# Altium footprint library PBL - THD Packages.PcbLib: 174 footprints (part 3 of 11)
Each footprint in its own frame and in the unit in brackets; x right, y up, seen from the top. Pads: shape width x height; smd on the part's side, far side on the other; paste and mask are expansions set on the pad; w line width, h text height; cw(c..) or ccw(c..) is an arc to the next point about the centre after c.
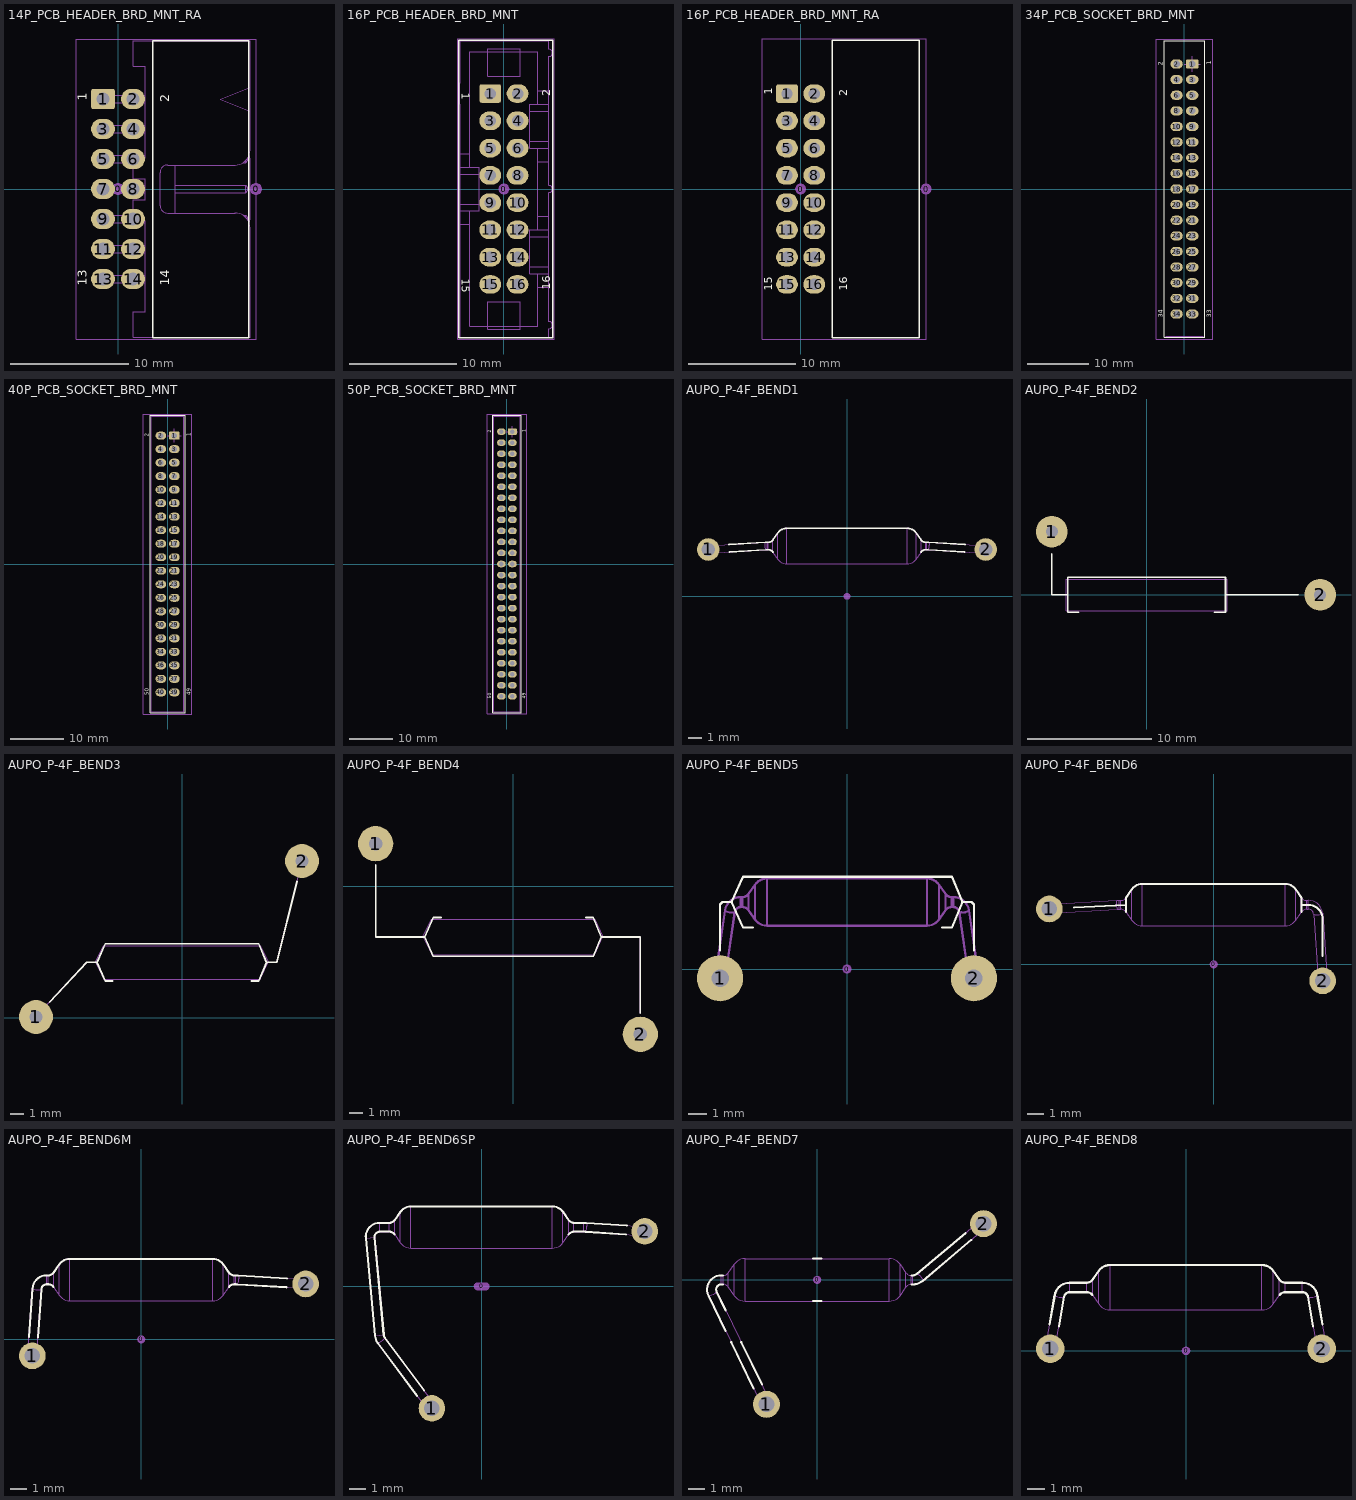
[diagram p2: the footprints below, top view; thin cyan lines are the x and y axes]

## 14P_PCB_HEADER_BRD_MNT_RA [mil] "HEADER BRD MNT R/A 14POS 2.54MM"
height 338
pads (16):
  round 40 on Mech15: 0(0,0) 0(460,0)
  rrect25% 80x68 hole 42: 1(-50,300)
  oval 80x68 hole 42: 2(50,300) 3(-50,200) 4(50,200) 5(-50,100) 6(50,100) 7(-50,0) 8(50,0) 9(-50,-100) 10(50,-100) 11(-50,-200) 12(50,-200) 13(-50,-300) 14(50,-300)
Top Overlay:
  lines w5: 115,-495 435,-495 435,495 115,495 115,-495
  text "13" at -105,-323 h30
  text "14" at 170,-323 h30
  text "1" at -105,295 h30
  text "2" at 170,290 h30
13 - 3D Top Side:
  lines w1.97: -17.5,-312.25 -17.5,-287.75 ; -17.5,-212.25 -17.5,-187.75 ; -17.5,-112.25 -17.5,-87.75 ; -17.5,-12.25 -17.5,12.25 ; -17.5,87.75 -17.5,112.25 ; -17.5,187.75 -17.5,212.25 ; -17.5,287.75 -17.5,312.25 ; 50,-87.75 -62.5,-87.75 -62.5,-112.25 90,-112.25 ; 50,87.75 -62.5,87.75 -62.5,112.25 90,112.25 ; 90,-312.25 -62.5,-312.25 -62.5,-287.75 90,-287.75 ; 90,-212.25 -62.5,-212.25 -62.5,-187.75 90,-187.75 ; 90,-12.25 -62.5,-12.25 -62.5,12.25 90,12.25 ; 90,187.75 -62.5,187.75 -62.5,212.25 90,212.25 ; 90,287.75 -62.5,287.75 -62.5,312.25 90,312.25 ; 190,-80 190,80 ; 190,-12.25 425,-12.25 ; 190,12.25 425,12.25 ; 416.74,-87.75 425,-87.75 ; 416.74,87.75 425,87.75 ; 425,-94.29 425,-87.75 ; 425,94.29 425,87.75 ; 433,-104.25 433,-95.75 425,-87.75 ; 433,104.25 433,95.75 425,87.75 ; 437.7,-115 ccw(c390,-100) 440,-100 440,100 ccw(c390,100) 437.7,115 ; 440,260 340,300 440,340 ; 425,-12.25 433,-4.25 433,4.25 425,12.25 ; 425,-12.25 425,12.25 ; 50,-494 50,-409 90,-409 90,-105 50,-105 50,-35 90,-35 90,35 50,35 50,105 90,105 90,409 50,409 50,494 440,494 440,130 cw(c390,130) 390,80 165,80 ccw(c165,55) 140,55 140,-55 ccw(c165,-55) 165,-80 390,-80 cw(c390,-130) 440,-130 440,-494 50,-494
15 - Top Courtyards:
  lines w3: -140,-500 460,-500 460,500 -140,500 -140,-500
3D body: height 340, standoff -112, extent -62.49,-493.99 440.01,494.01

## 16P_PCB_HEADER_BRD_MNT [mil] "HEADER BRD MNT 16POS 2.54MM"
height 390
pads (17):
  round 40 on Mech15: 0(0,0)
  rrect25% 80x68 hole 42: 1(-50,350)
  oval 80x68 hole 42: 2(50,350) 3(-50,250) 4(50,250) 5(-50,150) 6(50,150) 7(-50,50) 8(50,50) 9(-50,-50) 10(50,-50) 11(-50,-150) 12(50,-150) 13(-50,-250) 14(50,-250) 15(-50,-350) 16(50,-350)
Top Overlay:
  lines w5: -165,-545 180,-545 180,545 -165,545 -165,-545
  text "15" at -155,-329 h30
  text "16" at 170,-370.28 h30
  text "1" at -155,353.57 h30
  text "2" at 170,340 h30
13 - 3D Top Side:
  drawing of 242 lines, arcs and shapes, not listed
15 - Top Courtyards:
  lines w3: -170,-550 185,-550 185,550 -170,550 -170,-550
3D body: height 390, standoff -120, extent -161.99,-543.99 178.01,544.01

## 16P_PCB_HEADER_BRD_MNT_RA [mil] "HEADER BRD MNT R/A 16POS 2.54MM"
height 338
pads (18):
  round 40 on Mech15: 0(0,0) 0(460,0)
  rrect25% 80x68 hole 42: 1(-50,350)
  oval 80x68 hole 42: 2(50,350) 3(-50,250) 4(50,250) 5(-50,150) 6(50,150) 7(-50,50) 8(50,50) 9(-50,-50) 10(50,-50) 11(-50,-150) 12(50,-150) 13(-50,-250) 14(50,-250) 15(-50,-350) 16(50,-350)
Top Overlay:
  lines w5: 115,-545 115,545 435,545 435,-545 115,-545
  text "2" at 170,340 h30
  text "1" at -105,345 h30
  text "16" at 170,-373 h30
  text "15" at -105,-373 h30
15 - Top Courtyards:
  lines w3: -140,-550 -140,550 460,550 460,-550 -140,-550
3D body: height 340, standoff -112, extent -62.24,-543.99 440.01,544.01

## 34P_PCB_SOCKET_BRD_MNT [mm] "SOCKET BRD MNT 34POS 2.54MM"
height 10.8
pads (34):
  rrect25% 2x1.5 hole 1.067: 1(1.27,20.32)
  oval 2x1.5 hole 1.067: 2(-1.27,20.32) 3(1.27,17.78) 4(-1.27,17.78) 5(1.27,15.24) 6(-1.27,15.24) 7(1.27,12.7) 8(-1.27,12.7) 9(1.27,10.16) 10(-1.27,10.16) 11(1.27,7.62) 12(-1.27,7.62) 13(1.27,5.08) 14(-1.27,5.08) 15(1.27,2.54) 16(-1.27,2.54) 17(1.27,0) 18(-1.27,0) 19(1.27,-2.54) 20(-1.27,-2.54) 21(1.27,-5.08) 22(-1.27,-5.08) 23(1.27,-7.62) 24(-1.27,-7.62) 25(1.27,-10.16) 26(-1.27,-10.16) 27(1.27,-12.7) 28(-1.27,-12.7) 29(1.27,-15.24) 30(-1.27,-15.24) 31(1.27,-17.78) 32(-1.27,-17.78) 33(1.27,-20.32) 34(-1.27,-20.32)
Top Overlay:
  lines w0.127: -3.302,-24.13 3.302,-24.13 3.302,24.13 -3.302,24.13 -3.302,-24.13
  text "34" at -3.556,-20.904 h0.76
  text "33" at 4.318,-20.904 h0.76
  text "2" at -3.556,20.066 h0.76
  text "1" at 4.318,20.193 h0.76
13 - 3D Top Side:
  lines w0.076: -3.05,-23.92 3.05,-23.92
15 - Top Courtyards:
  lines w0.076: 0,20.32 2.54,20.32 ; 1.27,19.05 1.27,21.59 ; -4.572,-24.384 4.572,-24.384 4.572,24.384 -4.572,24.384 -4.572,-24.384
3D body: height 10.8, standoff -2.8, extent -3.05,-23.925 4.05,23.915

## 40P_PCB_SOCKET_BRD_MNT [mm] "SOCKET BRD MNT 40POS 2.54MM"
height 10.8
pads (40):
  rrect25% 2x1.5 hole 1.067: 1(1.27,24.13)
  oval 2x1.5 hole 1.067: 2(-1.27,24.13) 3(1.27,21.59) 4(-1.27,21.59) 5(1.27,19.05) 6(-1.27,19.05) 7(1.27,16.51) 8(-1.27,16.51) 9(1.27,13.97) 10(-1.27,13.97) 11(1.27,11.43) 12(-1.27,11.43) 13(1.27,8.89) 14(-1.27,8.89) 15(1.27,6.35) 16(-1.27,6.35) 17(1.27,3.81) 18(-1.27,3.81) 19(1.27,1.27) 20(-1.27,1.27) 21(1.27,-1.27) 22(-1.27,-1.27) 23(1.27,-3.81) 24(-1.27,-3.81) 25(1.27,-6.35) 26(-1.27,-6.35) 27(1.27,-8.89) 28(-1.27,-8.89) 29(1.27,-11.43) 30(-1.27,-11.43) 31(1.27,-13.97) 32(-1.27,-13.97) 33(1.27,-16.51) 34(-1.27,-16.51) 35(1.27,-19.05) 36(-1.27,-19.05) 37(1.27,-21.59) 38(-1.27,-21.59) 39(1.27,-24.13) 40(-1.27,-24.13)
Top Overlay:
  lines w0.127: -3.302,-27.94 3.302,-27.94 3.302,27.94 -3.302,27.94 -3.302,-27.94
  text "1" at 4.318,24.003 h0.76
  text "2" at -3.556,23.876 h0.76
  text "49" at 4.318,-24.714 h0.76
  text "50" at -3.556,-24.714 h0.76
13 - 3D Top Side:
  lines w0.076: -3.05,-27.73 -3.05,27.73 3.05,27.73 3.05,-27.73 -3.05,-27.73
15 - Top Courtyards:
  lines w0.076: 0,24.13 2.54,24.13 ; 1.27,22.86 1.27,25.4 ; -4.572,-28.194 4.572,-28.194 4.572,28.194 -4.572,28.194 -4.572,-28.194
3D body: height 10.8, standoff -2.54, extent -3.05,-27.73 4.05,27.73

## 50P_PCB_SOCKET_BRD_MNT [mm] "SOCKET BRD MNT 50POS 2.54MM"
height 10.8
pads (50):
  rrect25% 2x1.5 hole 1.067: 1(1.27,30.48)
  oval 2x1.5 hole 1.067: 2(-1.27,30.48) 3(1.27,27.94) 4(-1.27,27.94) 5(1.27,25.4) 6(-1.27,25.4) 7(1.27,22.86) 8(-1.27,22.86) 9(1.27,20.32) 10(-1.27,20.32) 11(1.27,17.78) 12(-1.27,17.78) 13(1.27,15.24) 14(-1.27,15.24) 15(1.27,12.7) 16(-1.27,12.7) 17(1.27,10.16) 18(-1.27,10.16) 19(1.27,7.62) 20(-1.27,7.62) 21(1.27,5.08) 22(-1.27,5.08) 23(1.27,2.54) 24(-1.27,2.54) 25(1.27,0) 26(-1.27,0) 27(1.27,-2.54) 28(-1.27,-2.54) 29(1.27,-5.08) 30(-1.27,-5.08) 31(1.27,-7.62) 32(-1.27,-7.62) 33(1.27,-10.16) 34(-1.27,-10.16) 35(1.27,-12.7) 36(-1.27,-12.7) 37(1.27,-15.24) 38(-1.27,-15.24) 39(1.27,-17.78) 40(-1.27,-17.78) 41(1.27,-20.32) 42(-1.27,-20.32) 43(1.27,-22.86) 44(-1.27,-22.86) 45(1.27,-25.4) 46(-1.27,-25.4) 47(1.27,-27.94) 48(-1.27,-27.94) 49(1.27,-30.48) 50(-1.27,-30.48)
Top Overlay:
  lines w0.127: -3.302,-34.29 3.302,-34.29 3.302,34.29 -3.302,34.29 -3.302,-34.29
  text "1" at 4.318,30.353 h0.76
  text "2" at -3.556,30.226 h0.76
  text "49" at 4.318,-31.064 h0.76
  text "50" at -3.556,-31.064 h0.76
13 - 3D Top Side:
  lines w0.076: -3.05,-34.08 -3.05,34.08 3.05,34.08 3.05,-34.08 -3.05,-34.08
15 - Top Courtyards:
  lines w0.076: 0,30.48 2.54,30.48 ; 1.27,29.21 1.27,31.75 ; -4.572,-34.544 4.572,-34.544 4.572,34.544 -4.572,34.544 -4.572,-34.544
3D body: height 10.8, standoff -2.8, extent -3.05,-34.085 4.05,34.075

## AUPO_P-4F_BEND1 [mil] "Aupo P-4F TCO for positioning on IC legs"
height 100
pads (3):
  round 19.68 on Mech15: 0(0,0)
  round 65 / inner round 65 / far side round 90 hole 38: 1(-400,135) 2(400,135)
Top Overlay:
  lines w5: -339.97,149.43 -235.55,155.67 -232.42,155.8 -230.32,155.83 -226.38,155.83 ccw(c-226.38,171.57) -213.48,162.54 -199.33,182.75 cw(c-173.53,164.69) -173.53,196.18 173.53,196.18 cw(c173.53,164.69) 199.33,182.75 213.48,162.54 ccw(c226.38,171.57) 226.38,155.83 230.32,155.83 233.46,155.77 235.55,155.67 340.26,149.42 ; -338.67,127.82 -234.26,134.06 -232.69,134.13 -230.32,134.17 -226.38,134.17 cw(c-226.38,118.43) -213.48,127.46 ; 213.48,127.46 cw(c226.38,118.43) 226.38,134.17 230.32,134.17 231.91,134.15 234.26,134.06 338.97,127.8
13 - 3D Top Side:
  lines w1.97: -381.43,146.96 ccw(c-360.21,137.38) -380.14,125.34 ; 380.14,125.34 ccw(c367.63,134.29) 382.82,136.67 382.89,139.15 382.84,141.46 382.68,143.49 382.42,145.12 382.08,146.27 381.66,146.87 381.43,146.96 ; -235.55,155.67 ccw(c-214.34,146.09) -234.26,134.06 ; -235.55,155.67 -400.65,145.81 ccw(c-400,135) -399.35,124.19 -234.26,134.06 ; -235.55,155.67 -232.42,155.8 -230.32,155.83 ; -234.26,134.06 -232.69,134.13 -230.32,134.17 ; -230.32,134.17 -230.32,155.83 ; -230.32,134.17 -226.38,134.17 ; -230.32,155.83 -226.38,155.83 ; -226.38,134.17 cw(c-226.38,118.43) -213.48,127.46 ; -226.38,134.17 -226.38,155.83 ; -226.38,155.83 ccw(c-226.38,171.57) -213.48,162.54 ; -213.48,127.46 -213.48,162.54 ; -213.48,127.46 -199.33,107.25 ; -213.48,162.54 -199.33,182.75 ; -199.33,107.25 ccw(c-173.53,125.31) -173.53,93.82 ; -199.33,107.25 -199.33,182.75 ; -199.33,182.75 cw(c-173.53,164.69) -173.53,196.18 ; -173.53,93.82 -173.53,196.18 ; -173.53,93.82 173.53,93.82 ; -173.53,196.18 173.53,196.18 ; 173.53,93.82 ccw(c173.53,125.31) 199.33,107.25 ; 173.53,93.82 173.53,196.18 ; 173.53,196.18 cw(c173.53,164.69) 199.33,182.75 ; 199.33,107.25 199.33,182.75 ; 199.33,107.25 213.48,127.46 ; 199.33,182.75 213.48,162.54 ; 213.48,127.46 cw(c226.38,118.43) 226.38,134.17 ; 213.48,127.46 213.48,162.54 ; 213.48,162.54 ccw(c226.38,171.57) 226.38,155.83 ; 226.38,134.17 226.38,155.83 ; 226.38,134.17 230.32,134.17 ; 226.38,155.83 230.32,155.83 ; 230.32,134.17 230.32,155.83 ; 230.32,134.17 231.91,134.15 234.26,134.06 ; 230.32,155.83 233.46,155.77 235.55,155.67 ; 234.26,134.06 ccw(c221.76,143) 236.94,145.39 237.01,147.87 236.96,150.18 236.8,152.21 236.54,153.84 236.19,154.98 235.77,155.59 235.55,155.67 ; 234.26,134.06 399.35,124.19 ccw(c400,135) 400.65,145.81 235.55,155.67
3D body: height 40, standoff 0, extent -444.64,90.1 -355,179.92
3D body: height 104.36, standoff -98, extent -410.74,93.93 410.83,196.09
3D body: height 40, standoff 0, extent 355.36,90.1 445,179.92

## AUPO_P-4F_BEND2 [mil] "Aupo P-4F TCO for positioning on IC legs"
height 100
pads (2):
  round 100 hole 38: 1(-300,200) 2(550,0)
Top Overlay:
  lines w5: -300,130 -300,0 -250,0 ; -215,-55 -250,-55 -250,55 250,55 250,-55 215,-55 ; 250,0 480,0
13 - 3D Top Side:
  lines w3: -255,-50 -255,49.8 255,49.8 255,-50 -255,-50
3D body: height 55, standoff -95, extent -310,190.02 -290.08,209.98
3D body: height 65, standoff 45.08, extent -309.98,-0.02 -290.02,199.98
3D body: height 65, standoff 45.08, extent -299.5,-9.96 -254.5,10
3D body: height 65, standoff 45.08, extent 250,-9.96 550,10
3D body: height 104.61, standoff 5, extent -255,-50 255,49.8
3D body: height 55, standoff -95, extent 540,-9.98 559.92,9.99
3D body: height 65, standoff 45, extent 540,-9.98 559.9,9.94
3D body: height 65, standoff 45, extent -310,190.02 -290.1,209.94
3D body: height 65, standoff 45, extent -310,-10 -290.1,9.91

## AUPO_P-4F_BEND3 [mil] "Aupo P-4F TCO for positioning on IC legs"
height 100
pads (2):
  round 100 hole 38: 1(-431,3) 2(354,463)
Top Overlay:
  lines w5: -389.97,47.04 -281,164 -251,164 ; -205,109 -226.33,109 -251,164 ; 205,109 226.41,109 249,164 ; 338.95,403.01 279,164 249,164 ; -251,164 -226.38,219 226.38,219 249,164
13 - 3D Top Side:
  lines w3: -431,3 -280.63,164.37 -256,164.37 -231.3,213.8 231.3,213.8 254,164.37 278.63,164.37 354,463 ; -256,163.9 -231.3,114 231.3,114 254,163.9
3D body: height 105.02, standoff -94.88, extent -440.35,-6.96 364.65,473.01

## AUPO_P-4F_BEND4 [mil] "Aupo P-4F TCO for positioning on IC legs"
height 100
pads (2):
  round 100 hole 38: 1(-390,120) 2(360,-420)
Top Overlay:
  lines w5: -390,60 -390,-144 -251,-144 ; -226.38,-199 226.38,-199 249,-144 ; -226.38,-89 -251,-144 ; -226.33,-199 -251,-144 ; -226.33,-89 -205,-89 ; 205,-89 226.41,-89 249,-144 ; 360,-360 360,-144 249,-144
13 - 3D Top Side:
  lines w3: -390,60 -390,-144 -256,-144 ; -256,-144.1 -231.3,-194 231.3,-194 254,-144.1 ; -256,-143.63 -231.3,-94.2 231.3,-94.2 254,-143.63 ; 254,-144 360,-144 360,-360
3D body: height 105.02, standoff -94.88, extent -399.95,-430.6 369.97,129.36

## AUPO_P-4F_BEND5 [mil] "Aupo P-4F TCO for positioning on IC legs"
height 100
pads (3):
  round 19.68 on Mech15: 0(0,0)
  round 100 hole 38: 1(-275,-20) 2(275,-20)
Top Overlay:
  lines w5: -275,40 -275,140 -270,145 -250,145 ; -204,90 -225.33,90 -250,145 ; 206,90 227.41,90 250,145 ; 275,40 275,140 270,145 250,145 ; -250,145 -225.38,200 227.38,200 250,145
13 - 3D Top Side:
  lines w5: -282.92,0.59 ccw(c-269.19,19.56) -261.5,-2.55 ; 261.5,-2.55 ccw(c268.97,22.97) 282.85,0.28 282.92,0.59 ; -264.41,126.68 ccw(c-250.67,145.69) -242.98,123.53 ; -264.41,126.68 cw(c-230.49,121.52) -230.32,155.83 ; -264.41,126.68 -285.71,-18.43 ccw(c-275,-20) -264.29,-21.57 -242.98,123.54 ; -242.98,123.54 cw(c-230.48,121.51) -230.32,134.17 ; -230.32,134.17 -230.32,155.83 ; -230.32,134.17 -226.38,134.17 ; -230.32,155.83 -226.38,155.83 ; -226.38,134.17 cw(c-226.38,118.43) -213.48,127.46 ; -226.38,134.17 -226.38,155.83 ; -226.38,155.83 ccw(c-226.38,171.57) -213.48,162.54 ; -213.48,127.46 -213.48,162.54 ; -213.48,127.46 -199.33,107.25 ; -213.48,162.54 -199.33,182.75 ; -199.33,107.25 ccw(c-173.53,125.31) -173.53,93.82 ; -199.33,107.25 -199.33,182.75 ; -199.33,182.75 cw(c-173.53,164.69) -173.53,196.18 ; -173.53,93.82 -173.53,196.18 ; -173.53,93.82 173.53,93.82 ; -173.53,196.18 173.53,196.18 ; 173.53,93.82 ccw(c173.53,125.31) 199.33,107.25 ; 173.53,93.82 173.53,196.18 ; 173.53,196.18 cw(c173.53,164.69) 199.33,182.75 ; 199.33,107.25 199.33,182.75 ; 199.33,107.25 213.48,127.46 ; 199.33,182.75 213.48,162.54 ; 213.48,127.46 cw(c226.38,118.43) 226.38,134.17 ; 213.48,127.46 213.48,162.54 ; 213.48,162.54 ccw(c226.38,171.57) 226.38,155.83 ; 226.38,134.17 226.38,155.83 ; 226.38,134.17 230.32,134.17 ; 226.38,155.83 230.32,155.83 ; 230.32,134.17 cw(c230.48,121.51) 242.98,123.54 ; 230.32,134.17 230.32,155.83 ; 230.32,155.83 cw(c230.49,121.51) 264.41,126.68 ; 242.98,123.54 ccw(c250.45,149.1) 264.34,126.38 264.41,126.68 ; 242.98,123.54 264.29,-21.57 ccw(c275,-20) 285.83,-20 285.71,-18.43 264.41,126.68
3D body: height 102.36, standoff -100, extent -285.73,-30.8 285.83,196.09

## AUPO_P-4F_BEND6 [mil] "Aupo P-4F TCO for positioning on IC legs"
height 100
pads (3):
  round 19.68 on Mech15: 0(0,0)
  round 65 / inner round 65 / far side round 90 hole 38: 1(-400,135) 2(265,-40)
Top Overlay:
  lines w5: -340.17,138.21 -213.48,145 ; -213.48,127.46 -213.48,162.54 -199.33,182.75 cw(c-173.53,164.69) -173.53,196.18 173.53,196.18 cw(c173.53,164.69) 199.33,182.75 213.48,162.54 213.48,127.46 ; 213.48,145 230,145 cw(c230,110) 265,110 265,20
13 - 3D Top Side:
  lines w1.97: -381.43,146.96 ccw(c-359.97,137.39) -380.14,125.34 ; 252.86,-21.08 ccw(c262.11,4.31) 274.45,-19.73 274.46,-19.61 ; -235.55,155.67 ccw(c-214.1,146.11) -234.26,134.06 ; -235.55,155.67 -400.65,145.81 ccw(c-400,135) -399.35,124.19 -234.26,134.06 ; -235.55,155.67 -232.3,155.8 -230.32,155.83 ; -234.26,134.06 -232.78,134.13 -230.32,134.17 ; -230.32,134.17 -230.32,155.83 ; -230.32,134.17 -226.38,134.17 ; -230.32,155.83 -226.38,155.83 ; -226.38,134.17 cw(c-226.38,118.43) -213.48,127.46 ; -226.38,134.17 -226.38,155.83 ; -226.38,155.83 ccw(c-226.38,171.57) -213.48,162.54 ; -213.48,127.46 -199.33,107.25 ; -213.48,127.46 -213.48,162.54 ; -213.48,162.54 -199.33,182.75 ; -199.33,107.25 ccw(c-173.53,125.31) -173.53,93.82 ; -199.33,107.25 -199.33,182.75 ; -199.33,182.75 cw(c-173.53,164.69) -173.53,196.18 ; -173.53,93.82 -173.53,196.18 ; -173.53,93.82 173.53,93.82 ; -173.53,196.18 173.53,196.18 ; 173.53,93.82 ccw(c173.53,125.31) 199.33,107.25 ; 173.53,93.82 173.53,196.18 ; 173.53,196.18 cw(c173.53,164.69) 199.33,182.75 ; 199.33,107.25 199.33,182.75 ; 199.33,107.25 213.48,127.46 ; 199.33,182.75 213.48,162.54 ; 213.48,127.46 cw(c226.38,118.43) 226.38,134.17 ; 213.48,127.46 213.48,162.54 ; 213.48,162.54 ccw(c226.38,171.57) 226.38,155.83 ; 226.38,134.17 226.38,155.83 ; 226.38,134.17 230.32,134.17 ; 226.38,155.83 230.32,155.83 ; 230.32,134.17 cw(c230.47,121.52) 243.08,122.53 ; 230.32,134.17 230.32,155.83 ; 230.32,155.83 cw(c230.46,121.51) 264.69,124 ; 243.08,122.53 ccw(c252.33,147.93) 264.67,123.88 264.69,124 ; 243.08,122.53 254.2,-40.74 ccw(c265,-40) 275.83,-40 275.8,-39.26 264.69,124
3D body: height 40, standoff 0, extent -445,90.09 -355.36,179.91
3D body: height 102.87, standoff -99.49, extent -410.74,-50.8 275.83,196.09
3D body: height 40, standoff 0, extent 219.99,-84.91 309.64,4.91

## AUPO_P-4F_BEND6M [mil] "Aupo P-4F TCO for positioning on IC legs"
height 100
pads (3):
  round 19.68 on Mech15: 0(0,0)
  round 65 / inner round 65 / far side round 90 hole 38: 1(-265,-40) 2(400,135)
Top Overlay:
  lines w5: -272.66,6.54 -264.69,124.01 cw(c-230.48,121.53) -230.32,155.83 -226.38,155.83 ccw(c-226.38,171.57) -213.48,162.54 -199.33,182.75 cw(c-173.53,164.69) -173.53,196.18 173.53,196.18 cw(c173.53,164.69) 199.33,182.75 213.48,162.54 ccw(c226.38,171.57) 226.38,155.83 230.32,155.83 233.67,155.76 235.64,155.67 354.91,148.54 ; -251.05,5.07 -243.08,122.54 cw(c-230.46,121.51) -230.32,134.17 -226.38,134.17 cw(c-226.38,118.43) -213.48,127.46 ; 213.48,127.46 cw(c226.38,118.43) 226.38,134.17 230.32,134.17 231.82,134.16 234.34,134.05 353.62,126.93
13 - 3D Top Side:
  lines w1.97: -274.43,-19.69 ccw(c-262.06,2.73) -252.83,-21.16 ; 380.23,125.34 ccw(c367.39,134.41) 382.95,136.67 383.02,139.06 382.98,141.3 382.83,143.28 382.58,144.91 382.25,146.1 381.85,146.78 381.52,146.95 ; -264.69,124.01 ccw(c-252.3,146.47) -243.08,122.54 ; -264.69,124.01 cw(c-230.48,121.53) -230.32,155.83 ; -264.69,124.01 -275.76,-39.27 ccw(c-264.96,-40) -254.16,-40.73 -243.08,122.54 ; -243.08,122.54 cw(c-230.46,121.51) -230.32,134.17 ; -230.32,134.17 -230.32,155.83 ; -230.32,134.17 -226.38,134.17 ; -230.32,155.83 -226.38,155.83 ; -226.38,134.17 cw(c-226.38,118.43) -213.48,127.46 ; -226.38,134.17 -226.38,155.83 ; -226.38,155.83 ccw(c-226.38,171.57) -213.48,162.54 ; -213.48,127.46 -213.48,162.54 ; -213.48,127.46 -199.33,107.25 ; -213.48,162.54 -199.33,182.75 ; -199.33,107.25 ccw(c-173.53,125.31) -173.53,93.82 ; -199.33,107.25 -199.33,182.75 ; -199.33,182.75 cw(c-173.53,164.69) -173.53,196.18 ; -173.53,93.82 -173.53,196.18 ; -173.53,93.82 173.53,93.82 ; -173.53,196.18 173.53,196.18 ; 173.53,93.82 ccw(c173.53,125.31) 199.33,107.25 ; 173.53,93.82 173.53,196.18 ; 173.53,196.18 cw(c173.53,164.69) 199.33,182.75 ; 199.33,107.25 199.33,182.75 ; 199.33,107.25 213.48,127.46 ; 199.33,182.75 213.48,162.54 ; 213.48,127.46 cw(c226.38,118.43) 226.38,134.17 ; 213.48,127.46 213.48,162.54 ; 213.48,162.54 ccw(c226.38,171.57) 226.38,155.83 ; 226.38,134.17 226.38,155.83 ; 226.38,134.17 230.32,134.17 ; 226.38,155.83 230.32,155.83 ; 230.32,134.17 230.32,155.83 ; 230.32,134.17 231.82,134.16 234.34,134.05 ; 230.32,155.83 233.67,155.76 235.64,155.67 ; 234.34,134.05 ccw(c221.51,143.13) 237.07,145.38 237.13,147.77 237.09,150.02 236.94,152 236.69,153.63 236.36,154.82 235.96,155.5 235.64,155.67 ; 234.34,134.05 399.35,124.19 ccw(c400,135) 400.65,145.81 235.64,155.67
3D body: height 40, standoff 0, extent -309.64,-84.91 -220,4.92
3D body: height 102.95, standoff -100, extent -275.7,-50.8 410.83,196.09
3D body: height 40, standoff 0, extent 355.36,90.1 445,179.92

## AUPO_P-4F_BEND6SP [mil] "Aupo P-4F TCO for positioning on IC legs"
height 100
pads (3):
  oval 39.37x19.68 on Mech15: 0(0,0)
  round 65 / inner round 65 / far side round 90 hole 38: 1(-122.05,-299.21) 2(400,135)
Top Overlay:
  lines w5: -213.48,127.46 ccw(c-226.38,118.43) -226.38,134.17 -250,134.17 ccw(c-250,121.38) -262.74,120.18 -240.21,-119.23 ccw(c-226.81,-118) -237.62,-126.01 -141.14,-255.47 ; -158.51,-268.41 -254.99,-138.95 cw(c-226.81,-118) -261.77,-121.26 -284.3,118.15 cw(c-250,121.38) -250,155.83 -226.38,155.83 ccw(c-226.38,171.57) -213.48,162.54 -199.33,182.75 cw(c-173.53,164.69) -173.53,196.18 173.53,196.18 cw(c173.53,164.69) 199.33,182.75 213.48,162.54 ccw(c226.38,171.57) 226.38,155.83 250,155.83 253.99,155.74 256.09,155.62 355.88,148.85 ; 213.48,127.46 cw(c226.38,118.43) 226.38,134.17 250,134.17 251.63,134.15 254.63,134.02 354.42,127.24
13 - 3D Top Side:
  lines w1.97: -142.8,-289.48 ccw(c-154.49,-254.64) -126.6,-278.57 -125.76,-277.53 -125.4,-276.81 -125.44,-276.54 ; 380.81,125.45 ccw(c367.01,135.36) 383.94,136.83 384,139.39 383.93,141.77 383.72,143.84 383.38,145.46 382.93,146.54 382.4,147.03 382.28,147.05 ; -284.3,118.15 cw(c-250,121.38) -250,155.83 ; -284.3,118.15 -261.77,-121.26 ; -284.3,118.15 -262.74,120.18 ; -262.74,120.18 cw(c-250,121.38) -250,134.17 ; -262.74,120.18 -240.21,-119.23 ; -261.77,-121.26 ccw(c-226.81,-118) -254.99,-138.95 ; -261.77,-121.26 -240.21,-119.23 ; -254.99,-138.95 ccw(c-266.66,-104.11) -238.78,-128.04 -237.94,-127 -237.58,-126.28 -237.62,-126.01 ; -254.99,-138.95 -130.73,-305.68 ccw(c-122.05,-299.21) -113.37,-292.74 -237.62,-126.01 ; -250,134.17 -226.38,134.17 ; -250,134.17 -250,155.83 ; -250,155.83 -226.38,155.83 ; -240.21,-119.23 ccw(c-226.81,-118) -237.62,-126.01 ; -226.38,134.17 cw(c-226.38,118.43) -213.48,127.46 ; -226.38,134.17 -226.38,155.83 ; -226.38,155.83 ccw(c-226.38,171.57) -213.48,162.54 ; -213.48,127.46 -199.33,107.25 ; -213.48,127.46 -213.48,162.54 ; -213.48,162.54 -199.33,182.75 ; -199.33,107.25 ccw(c-173.53,125.31) -173.53,93.82 ; -199.33,107.25 -199.33,182.75 ; -199.33,182.75 cw(c-173.53,164.69) -173.53,196.18 ; -173.53,93.82 173.53,93.82 ; -173.53,93.82 -173.53,196.18 ; -173.53,196.18 173.53,196.18 ; 173.53,93.82 ccw(c173.53,125.31) 199.33,107.25 ; 173.53,93.82 173.53,196.18 ; 173.53,196.18 cw(c173.53,164.69) 199.33,182.75 ; 199.33,107.25 213.48,127.46 ; 199.33,107.25 199.33,182.75 ; 199.33,182.75 213.48,162.54 ; 213.48,127.46 cw(c226.38,118.43) 226.38,134.17 ; 213.48,127.46 213.48,162.54 ; 213.48,162.54 ccw(c226.38,171.57) 226.38,155.83 ; 226.38,134.17 250,134.17 ; 226.38,134.17 226.38,155.83 ; 226.38,155.83 250,155.83 ; 250,134.17 251.63,134.15 254.63,134.02 ; 250,134.17 250,155.83 ; 250,155.83 253.99,155.74 256.09,155.62 ; 254.63,134.02 ccw(c240.84,143.92) 257.75,145.39 257.82,147.96 257.74,150.34 257.53,152.4 257.19,154.02 256.74,155.11 256.22,155.6 256.09,155.62 ; 254.63,134.02 399.27,124.2 ccw(c400,135) 400.73,145.8 256.09,155.62
3D body: height 40, standoff 0, extent -166.69,-344.12 -77.04,-254.29
3D body: height 102.95, standoff -100, extent -284.29,-310.01 410.83,196.09
3D body: height 40, standoff 0, extent 355.36,90.1 445,179.92

## AUPO_P-4F_BEND7 [mil] "Aupo P-4F TCO for positioning on IC legs"
height 100
pads (3):
  round 19.68 on Mech15: 0(0,0)
  round 65 / inner round 65 / far side round 90 hole 38: 1(-122.05,-299.21) 2(400,135)
Top Overlay:
  lines w5: -226.38,-10.83 -230.32,-10.83 ccw(c-230.71,-23.12) -241.92,-28.19 -220,-73.23 ; -226.38,10.83 -230.32,10.83 ccw(c-230.77,-23.09) -261.39,-37.67 -220,-122.7 ; -206.71,-150 -152.67,-261.03 ; -182.63,-150 -133.2,-251.56 ; -10,-51.18 10,-51.18 ; -10,51.18 10,51.18 ; 226.38,-10.83 230.32,-10.83 ccw(c230.57,25.09) 253.54,-2.52 370.8,96.25 ; 226.38,10.83 230.32,10.83 ccw(c230.51,25.26) 239.59,14.04 356.85,112.81
13 - 3D Top Side:
  lines w1.97: -140.07,-286.92 ccw(c-140.58,-259.77) -121.17,-278.77 -120.63,-277.98 -120.6,-277.44 ; 380.65,132.86 381.22,133.11 382.26,133.05 383.6,132.53 385.15,131.57 386.84,130.24 388.57,128.61 390.25,126.76 391.78,124.79 393.1,122.81 394.11,120.92 394.78,119.23 395.06,117.83 394.95,116.8 394.6,116.3 ; -261.39,-37.67 ccw(c-261.89,-10.52) -242.49,-29.52 -241.95,-28.73 -241.91,-28.2 ; -261.39,-37.67 cw(c-230.77,-23.09) -230.32,10.83 ; -261.39,-37.67 -131.78,-303.95 ccw(c-122.05,-299.21) -111.22,-299.21 -111.51,-296.72 -112.31,-294.47 -241.92,-28.19 ; -241.92,-28.19 cw(c-230.71,-23.12) -230.32,-10.83 ; -230.32,-10.83 -230.32,10.83 ; -230.32,-10.83 -226.38,-10.83 ; -230.32,10.83 -226.38,10.83 ; -226.38,-10.83 cw(c-226.38,-26.57) -213.48,-17.54 ; -226.38,-10.83 -226.38,10.83 ; -226.38,10.83 ccw(c-226.38,26.57) -213.48,17.54 ; -213.48,-17.54 -213.48,17.54 ; -213.48,-17.54 -199.33,-37.75 ; -213.48,17.54 -199.33,37.75 ; -199.33,-37.75 ccw(c-173.53,-19.69) -173.53,-51.18 ; -199.33,-37.75 -199.33,37.75 ; -199.33,37.75 cw(c-173.53,19.69) -173.53,51.18 ; -173.53,-51.18 -173.53,51.18 ; -173.53,-51.18 173.53,-51.18 ; -173.53,51.18 173.53,51.18 ; 173.53,-51.18 ccw(c173.53,-19.68) 199.33,-37.75 ; 173.53,-51.18 173.53,51.18 ; 173.53,51.18 cw(c173.53,19.69) 199.33,37.75 ; 199.33,-37.75 199.33,37.75 ; 199.33,-37.75 213.48,-17.54 ; 199.33,37.75 213.48,17.54 ; 213.48,-17.54 cw(c226.38,-26.57) 226.38,-10.83 ; 213.48,-17.54 213.48,17.54 ; 213.48,17.54 ccw(c226.38,26.57) 226.38,10.83 ; 226.38,-10.83 226.38,10.83 ; 226.38,-10.83 230.32,-10.83 ; 226.38,10.83 230.32,10.83 ; 230.32,-10.83 ccw(c230.57,25.09) 253.54,-2.52 ; 230.32,-10.83 230.32,10.83 ; 230.32,10.83 ccw(c230.51,25.26) 239.59,14.04 ; 239.59,14.04 393.03,143.28 cw(c400,135) 406.98,126.72 253.54,-2.52 ; 239.59,14.04 240.15,14.29 241.2,14.23 242.54,13.7 244.09,12.75 245.78,11.42 247.51,9.79 249.19,7.94 250.72,5.97 252.03,3.99 253.05,2.1 253.72,0.41 254,-0.99 253.88,-2.02 253.54,-2.52
3D body: height 40, standoff 0, extent 355.36,90.1 445,179.92
3D body: height 137.8, standoff -100, extent -264.69,-310.01 410.83,145.81
3D body: height 40, standoff 0, extent -166.69,-344.12 -77.04,-254.29

## AUPO_P-4F_BEND8 [mil] "Aupo P-4F TCO for positioning on IC legs"
height 100
pads (3):
  round 19.68 on Mech15: 0(0,0)
  round 65 / inner round 65 / far side round 90 hole 38: 1(-310,5) 2(310,5)
Top Overlay:
  lines w5: -311.41,60.24 -299.71,127.69 cw(c-266,121.56) -265.75,155.83 -226.38,155.83 ccw(c-226.38,171.57) -213.48,162.54 -199.33,182.75 cw(c-173.53,164.69) -173.53,196.18 173.53,196.18 cw(c173.53,164.69) 199.33,182.75 213.48,162.54 ccw(c226.38,171.57) 226.38,155.83 265.75,155.83 cw(c265.99,121.56) 299.71,127.69 311.41,60.24 ; -290.07,56.54 -278.37,123.99 cw(c-265.97,121.53) -265.75,134.17 -226.38,134.17 cw(c-226.38,118.43) -213.48,127.46 ; 213.48,127.46 cw(c226.38,118.43) 226.38,134.17 265.75,134.17 cw(c266,121.57) 278.37,123.99 290.07,56.54
13 - 3D Top Side:
  lines w1.97: -317.54,24.86 -317.55,24.7 -317.24,24.12 -316.45,23.48 -315.22,22.83 -313.59,22.18 -311.65,21.57 -309.48,21.03 -307.2,20.58 -304.9,20.24 -302.69,20.03 -300.67,19.97 -298.95,20.04 -297.6,20.25 -296.68,20.6 -296.24,21.05 -296.21,21.16 ; -299.62,127.25 ccw(c-286.09,144.54) -278.37,123.99 ; 296.21,21.16 ccw(c303.94,41.66) 317.46,24.42 317.54,24.86 ; 299.62,127.25 cw(c286.09,144.54) 278.37,123.99 ; -278.37,123.99 cw(c-265.97,121.53) -265.75,134.17 ; -278.37,123.99 -299.33,3.15 cw(c-310,5) -320.67,6.85 -299.71,127.69 cw(c-266,121.56) -265.75,155.83 ; -265.75,134.17 -226.38,134.17 ; -265.75,134.17 -265.75,155.83 ; -265.75,155.83 -226.38,155.83 ; -226.38,134.17 cw(c-226.38,118.43) -213.48,127.46 ; -226.38,134.17 -226.38,155.83 ; -226.38,155.83 ccw(c-226.38,171.57) -213.48,162.54 ; -213.48,127.46 -199.33,107.25 ; -213.48,127.46 -213.48,162.54 ; -213.48,162.54 -199.33,182.75 ; -199.33,107.25 ccw(c-173.53,125.31) -173.53,93.82 ; -199.33,107.25 -199.33,182.75 ; -199.33,182.75 cw(c-173.53,164.69) -173.53,196.18 ; -173.53,93.82 173.53,93.82 ; -173.53,93.82 -173.53,196.18 ; -173.53,196.18 173.53,196.18 ; 173.53,93.82 ccw(c173.53,125.31) 199.33,107.25 ; 173.53,93.82 173.53,196.18 ; 173.53,196.18 cw(c173.53,164.69) 199.33,182.75 ; 199.33,107.25 213.48,127.46 ; 199.33,107.25 199.33,182.75 ; 199.33,182.75 213.48,162.54 ; 213.48,127.46 cw(c226.38,118.43) 226.38,134.17 ; 213.48,127.46 213.48,162.54 ; 213.48,162.54 ccw(c226.38,171.57) 226.38,155.83 ; 226.38,134.17 265.75,134.17 ; 226.38,134.17 226.38,155.83 ; 226.38,155.83 265.75,155.83 ; 265.75,134.17 cw(c266,121.57) 278.37,123.99 ; 265.75,134.17 265.75,155.83 ; 265.75,155.83 cw(c265.99,121.56) 299.71,127.69 320.67,6.85 320.83,5 cw(c310,5) 299.33,3.15 278.37,123.99
3D body: height 40, standoff 0, extent -354.64,-39.9 -265,49.92
3D body: height 104.95, standoff -98, extent -320.74,-5.8 320.83,196.09
3D body: height 40, standoff 0, extent 265.36,-39.9 355,49.92